# Altium footprint library 4.49-接插件.PcbLib: 260 footprints (part 12 of 17)
Each footprint in its own frame and in the unit in brackets; x right, y up, seen from the top. Pads: shape width x height; smd on the part's side, far side on the other; paste and mask are expansions set on the pad; w line width, h text height; cw(c..) or ccw(c..) is an arc to the next point about the centre after c.
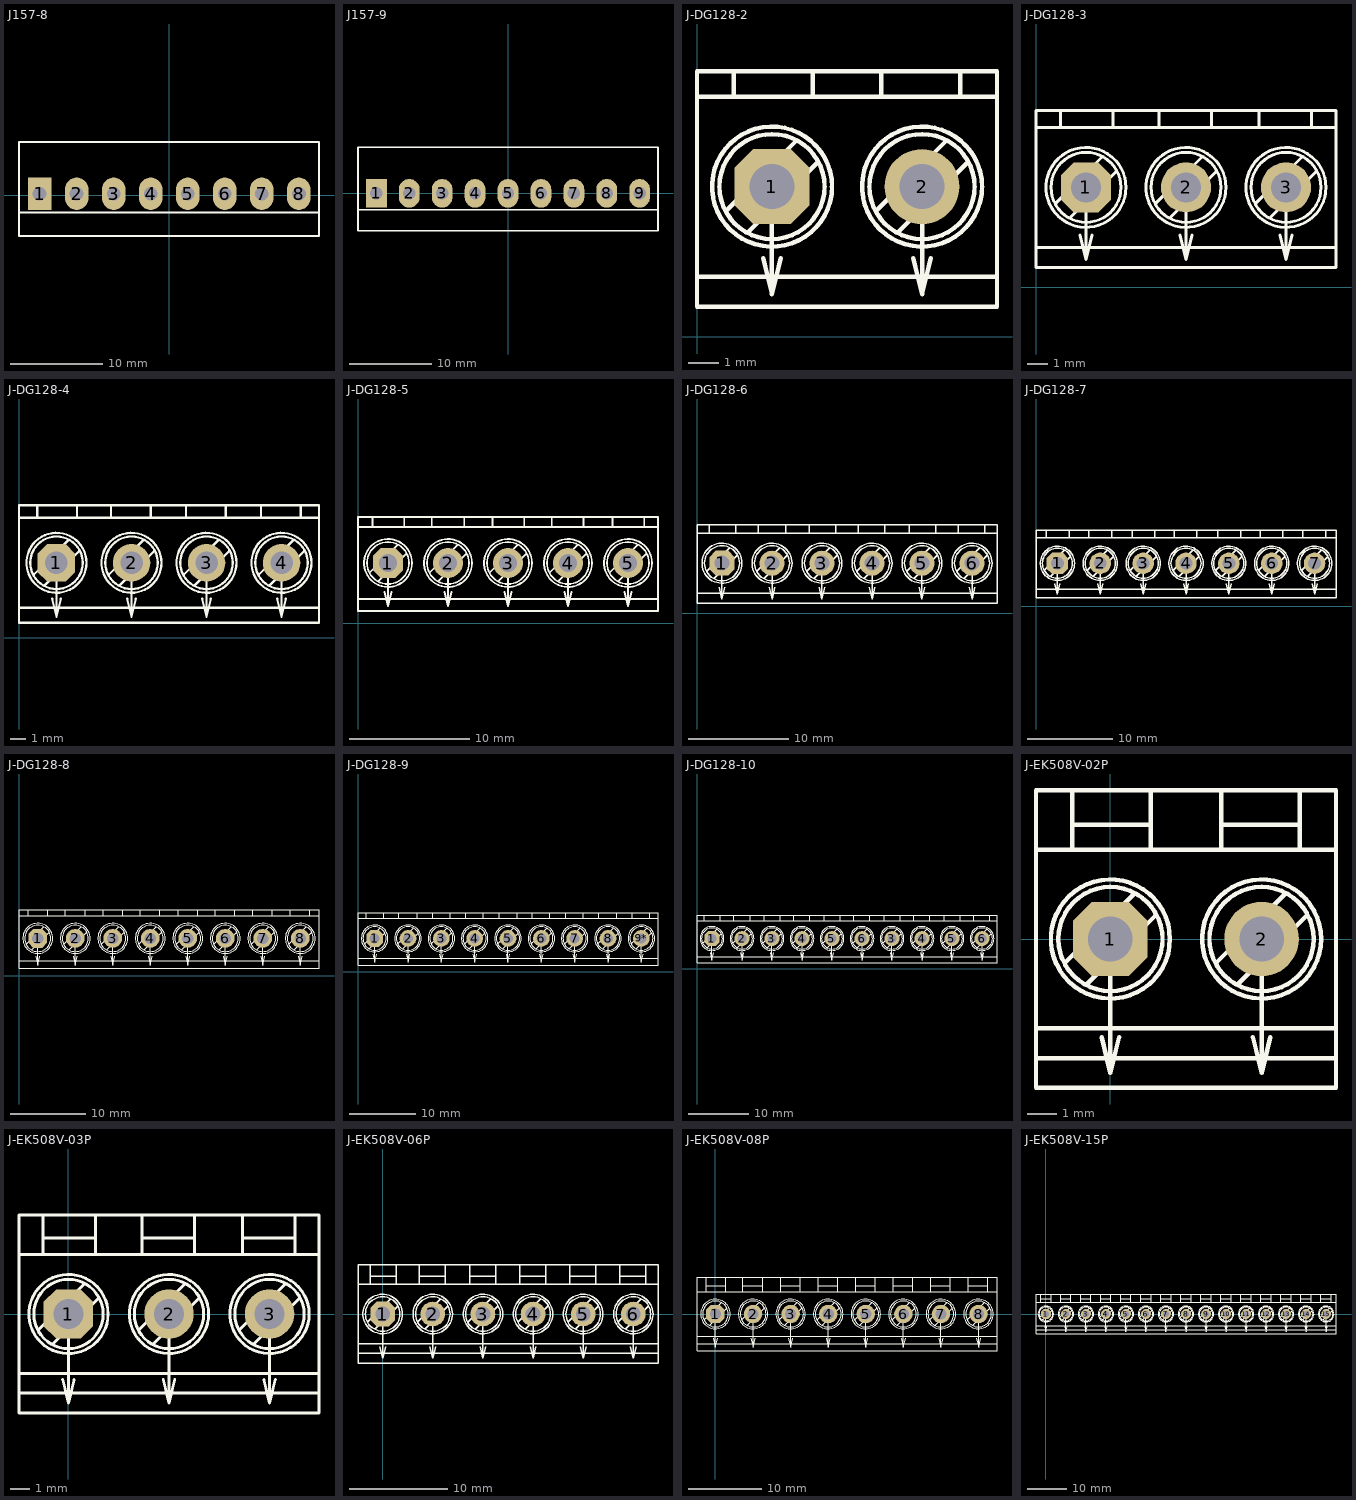
[diagram p11: the footprints below, top view; thin cyan lines are the x and y axes]

## J157-8 [mil] "[ PCBѧϰȺ514746572 ]"
pads (8):
  rect 100x138 hole 59: 1(-554,6.79)
  oval 100x138 hole 59: 2(-396,6.79) 3(-238,6.79) 4(-80,6.79) 5(78,6.79) 6(236,6.79) 7(394,6.79) 8(552,6.79)
Top Overlay:
  lines w8: -642,-73.21 638,-73.21 ; -642,-173.21 638,-173.21 638,226.79 -642,226.79 -642,-173.21
3D body "4514.stp": height 585, standoff -135, extent -619,-188 623,206

## J157-9 [mil] "[ PCBѧϰȺ514746572 ]"
pads (9):
  rect 100x138 hole 59: 1(-632,0)
  oval 100x138 hole 59: 2(-474,0) 3(-316,0) 4(-158,0) 5(0,0) 6(158,0) 7(316,0) 8(474,0) 9(632,0)
Top Overlay:
  lines w8: -720,-79.21 720,-79.21 ; 718,220.79 -720,220.79 -720,-179.21 720,-179.21 720,220.79
3D body "4877.stp": height 575, standoff -145, extent -699,-194 699,200

## J-DG128-2 [mm] "[ PCBѧϰȺ514746572 ]"
pads (2):
  oct 2.5x2.5 hole 1.5: 1(2.5,5)
  round 2.5 hole 1.5: 2(7.5,5)
Top Overlay:
  circle w0.15: c7.5,5 r2
  circle w0.15: c7.5,5 r1.75
  circle w0.15: c2.5,5 r2
  circle w0.15: c2.5,5 r1.75
  lines w0.15: 0,2 10,2 ; 0,8 10,8 ; 0.987,4.209 3.298,6.52 ; 1.219,8 1.219,8.839 ; 1.702,3.48 4.013,5.791 ; 2.21,2.611 2.5,1.406 ; 2.5,5 2.5,1.406 ; 2.79,2.611 2.5,1.406 ; 3.861,8 3.861,8.839 ; 5.987,4.209 8.298,6.52 ; 6.139,8 6.139,8.839 ; 6.702,3.48 9.013,5.791 ; 7.21,2.611 7.5,1.406 ; 7.5,5 7.5,1.406 ; 7.79,2.611 7.5,1.406 ; 8.781,8 8.781,8.839 ; 0,1 10,1 10,8.839 0,8.839 0,1
3D body "User Library-CN_BT_1X2.step": height 10, standoff -2.28, extent -0.491,1.15 10.009,8.85

## J-DG128-3 [mm] "[ PCBѧϰȺ514746572 ]"
pads (3):
  oct 2.5x2.5 hole 1.5: 1(2.5,5)
  round 2.5 hole 1.5: 2(7.5,5) 3(12.5,5)
Top Overlay:
  circle w0.15: c12.5,5 r1.75
  circle w0.15: c12.5,5 r2
  circle w0.15: c2.5,5 r1.75
  circle w0.15: c2.5,5 r2
  circle w0.15: c7.5,5 r1.75
  circle w0.15: c7.5,5 r2
  lines w0.15: 0,2 15,2 ; 0,8 15,8 ; 0.987,4.209 3.298,6.52 ; 1.219,8 1.219,8.839 ; 1.702,3.48 4.013,5.791 ; 2.21,2.611 2.5,1.406 ; 2.5,5 2.5,1.406 ; 2.79,2.611 2.5,1.406 ; 3.861,8 3.861,8.839 ; 5.987,4.209 8.298,6.52 ; 6.139,8 6.139,8.839 ; 6.702,3.48 9.013,5.791 ; 7.21,2.611 7.5,1.406 ; 7.5,5 7.5,1.406 ; 7.79,2.611 7.5,1.406 ; 8.781,8 8.781,8.839 ; 10.987,4.209 13.298,6.52 ; 11.139,8 11.139,8.839 ; 11.702,3.48 14.013,5.791 ; 12.21,2.611 12.5,1.406 ; 12.5,5 12.5,1.406 ; 12.79,2.611 12.5,1.406 ; 13.781,8 13.781,8.839 ; 0,1 0,8.839 15,8.839 15,1 0,1
3D body "User Library-CN_BT_1X3.step": height 10.05, standoff -2.24, extent -0.556,1.15 14.944,8.85

## J-DG128-4 [mm] "[ PCBѧϰȺ514746572 ]"
pads (4):
  oct 2.5x2.5 hole 1.5: 1(2.5,5)
  round 2.5 hole 1.5: 2(7.5,5) 3(12.5,5) 4(17.5,5)
Top Overlay:
  circle w0.15: c17.5,5 r2
  circle w0.15: c17.5,5 r1.75
  circle w0.15: c12.5,5 r1.75
  circle w0.15: c12.5,5 r2
  circle w0.15: c2.5,5 r1.75
  circle w0.15: c2.5,5 r2
  circle w0.15: c7.5,5 r1.75
  circle w0.15: c7.5,5 r2
  lines w0.15: 0,2 20,2 ; 0,8 20,8 ; 0.987,4.209 3.298,6.52 ; 1.219,8 1.219,8.839 ; 1.702,3.48 4.013,5.791 ; 2.21,2.611 2.5,1.406 ; 2.5,5 2.5,1.406 ; 2.79,2.611 2.5,1.406 ; 3.861,8 3.861,8.839 ; 5.987,4.209 8.298,6.52 ; 6.139,8 6.139,8.839 ; 6.702,3.48 9.013,5.791 ; 7.21,2.611 7.5,1.406 ; 7.5,5 7.5,1.406 ; 7.79,2.611 7.5,1.406 ; 8.781,8 8.781,8.839 ; 10.987,4.209 13.298,6.52 ; 11.139,8 11.139,8.839 ; 11.702,3.48 14.013,5.791 ; 12.21,2.611 12.5,1.406 ; 12.5,5 12.5,1.406 ; 12.79,2.611 12.5,1.406 ; 13.781,8 13.781,8.839 ; 15.987,4.209 18.298,6.52 ; 16.139,8 16.139,8.839 ; 16.702,3.48 19.013,5.791 ; 17.21,2.611 17.5,1.406 ; 17.5,5 17.5,1.406 ; 17.79,2.611 17.5,1.406 ; 18.781,8 18.781,8.839 ; 0,1 0,8.839 20,8.839 20,1 0,1
3D body "SW3dPS-KRM4.STEP": height 10, standoff -4, extent 0,1.414 20,8.914

## J-DG128-5 [mm] "[ PCBѧϰȺ514746572 ]"
pads (5):
  oct 2.5x2.5 hole 1.5: 1(2.5,5)
  round 2.5 hole 1.5: 2(7.5,5) 3(12.5,5) 4(17.5,5) 5(22.5,5)
Top Overlay:
  circle w0.15: c7.5,5 r2
  circle w0.15: c7.5,5 r1.75
  circle w0.15: c2.5,5 r2
  circle w0.15: c2.5,5 r1.75
  circle w0.15: c12.5,5 r1.75
  circle w0.15: c12.5,5 r2
  circle w0.15: c17.5,5 r1.75
  circle w0.15: c17.5,5 r2
  circle w0.15: c22.5,5 r1.75
  circle w0.15: c22.5,5 r2
  lines w0.15: 0,2 10,2 20,2 24.958,2 ; 0,8 10,8 20,8 24.958,8 ; 0.987,4.209 3.298,6.52 ; 1.219,8 1.219,8.839 ; 1.702,3.48 4.013,5.791 ; 2.21,2.611 2.5,1.406 ; 2.5,5 2.5,1.406 ; 2.79,2.611 2.5,1.406 ; 3.861,8 3.861,8.839 ; 5.987,4.209 8.298,6.52 ; 6.139,8 6.139,8.839 ; 6.702,3.48 9.013,5.791 ; 7.21,2.611 7.5,1.406 ; 7.5,5 7.5,1.406 ; 7.79,2.611 7.5,1.406 ; 8.861,8 8.861,8.839 ; 10.987,4.209 13.298,6.52 ; 11.219,8 11.219,8.839 ; 11.702,3.48 14.013,5.791 ; 12.21,2.611 12.5,1.406 ; 12.5,5 12.5,1.406 ; 12.79,2.611 12.5,1.406 ; 13.861,8 13.861,8.839 ; 15.987,4.209 18.298,6.52 ; 16.139,8 16.139,8.839 ; 16.702,3.48 19.013,5.791 ; 17.21,2.611 17.5,1.406 ; 17.5,5 17.5,1.406 ; 17.79,2.611 17.5,1.406 ; 18.781,8 18.781,8.839 ; 20.987,4.209 23.298,6.52 ; 21.219,8 21.219,8.839 ; 21.702,3.48 24.013,5.791 ; 22.21,2.611 22.5,1.406 ; 22.5,5 22.5,1.406 ; 22.79,2.611 22.5,1.406 ; 23.861,8 23.861,8.839 ; 24.958,1 20,1 10,1 0,1 0,8.839 24.958,8.839 ; 25,1 25,8.839
3D body "SW3dPS-KRM5.STEP": height 10, standoff -4, extent -0.021,1.414 24.979,8.914

## J-DG128-6 [mm] "[ PCBѧϰȺ514746572 ]"
pads (6):
  oct 2.5x2.5 hole 1.5: 1(2.5,5)
  round 2.5 hole 1.5: 2(7.5,5) 3(12.5,5) 4(17.5,5) 5(22.5,5) 6(27.5,5)
Top Overlay:
  circle w0.15: c27.5,5 r2
  circle w0.15: c27.5,5 r1.75
  circle w0.15: c22.5,5 r2
  circle w0.15: c22.5,5 r1.75
  circle w0.15: c17.5,5 r2
  circle w0.15: c17.5,5 r1.75
  circle w0.15: c12.5,5 r2
  circle w0.15: c12.5,5 r1.75
  circle w0.15: c2.5,5 r1.75
  circle w0.15: c2.5,5 r2
  circle w0.15: c7.5,5 r1.75
  circle w0.15: c7.5,5 r2
  lines w0.15: 0,2 10,2 20,2 30,2 ; 0,8 10,8 20,8 30,8 ; 0.987,4.209 3.298,6.52 ; 1.219,8 1.219,8.839 ; 1.702,3.48 4.013,5.791 ; 2.21,2.611 2.5,1.406 ; 2.5,5 2.5,1.406 ; 2.79,2.611 2.5,1.406 ; 3.861,8 3.861,8.839 ; 5.987,4.209 8.298,6.52 ; 6.139,8 6.139,8.839 ; 6.702,3.48 9.013,5.791 ; 7.21,2.611 7.5,1.406 ; 7.5,5 7.5,1.406 ; 7.79,2.611 7.5,1.406 ; 8.861,8 8.861,8.839 ; 10.987,4.209 13.298,6.52 ; 11.219,8 11.219,8.839 ; 11.702,3.48 14.013,5.791 ; 12.21,2.611 12.5,1.406 ; 12.5,5 12.5,1.406 ; 12.79,2.611 12.5,1.406 ; 13.861,8 13.861,8.839 ; 15.987,4.209 18.298,6.52 ; 16.139,8 16.139,8.839 ; 16.702,3.48 19.013,5.791 ; 17.21,2.611 17.5,1.406 ; 17.5,5 17.5,1.406 ; 17.79,2.611 17.5,1.406 ; 18.781,8 18.781,8.839 ; 20.987,4.209 23.298,6.52 ; 21.219,8 21.219,8.839 ; 21.702,3.48 24.013,5.791 ; 22.21,2.611 22.5,1.406 ; 22.5,5 22.5,1.406 ; 22.79,2.611 22.5,1.406 ; 23.861,8 23.861,8.839 ; 25.987,4.209 28.298,6.52 ; 26.139,8 26.139,8.839 ; 26.702,3.48 29.013,5.791 ; 27.21,2.611 27.5,1.406 ; 27.5,5 27.5,1.406 ; 27.79,2.611 27.5,1.406 ; 28.781,8 28.781,8.839 ; 0,1 0,8.839 30,8.839 30,1 20,1 10,1 0,1
3D body "SW3dPS-KRM6.STEP": height 10, standoff -4, extent 0,1.414 30,8.914

## J-DG128-7 [mm] "[ PCBѧϰȺ514746572 ]"
pads (7):
  oct 2.5x2.5 hole 1.5: 1(2.5,5)
  round 2.5 hole 1.5: 2(7.5,5) 3(12.5,5) 4(17.5,5) 5(22.5,5) 6(27.5,5) 7(32.5,5)
Top Overlay:
  circle w0.15: c32.5,5 r2
  circle w0.15: c32.5,5 r1.75
  circle w0.15: c7.5,5 r2
  circle w0.15: c7.5,5 r1.75
  circle w0.15: c2.5,5 r2
  circle w0.15: c2.5,5 r1.75
  circle w0.15: c12.5,5 r1.75
  circle w0.15: c12.5,5 r2
  circle w0.15: c17.5,5 r1.75
  circle w0.15: c17.5,5 r2
  circle w0.15: c22.5,5 r1.75
  circle w0.15: c22.5,5 r2
  circle w0.15: c27.5,5 r1.75
  circle w0.15: c27.5,5 r2
  lines w0.15: 0,2 10,2 20,2 35,2 ; 0,8 10,8 20,8 35,8 ; 0.987,4.209 3.298,6.52 ; 1.219,8 1.219,8.839 ; 1.702,3.48 4.013,5.791 ; 2.21,2.611 2.5,1.406 ; 2.5,5 2.5,1.406 ; 2.79,2.611 2.5,1.406 ; 3.861,8 3.861,8.839 ; 5.987,4.209 8.298,6.52 ; 6.139,8 6.139,8.839 ; 6.702,3.48 9.013,5.791 ; 7.21,2.611 7.5,1.406 ; 7.5,5 7.5,1.406 ; 7.79,2.611 7.5,1.406 ; 8.861,8 8.861,8.839 ; 10.987,4.209 13.298,6.52 ; 11.219,8 11.219,8.839 ; 11.702,3.48 14.013,5.791 ; 12.21,2.611 12.5,1.406 ; 12.5,5 12.5,1.406 ; 12.79,2.611 12.5,1.406 ; 13.861,8 13.861,8.839 ; 15.987,4.209 18.298,6.52 ; 16.139,8 16.139,8.839 ; 16.702,3.48 19.013,5.791 ; 17.21,2.611 17.5,1.406 ; 17.5,5 17.5,1.406 ; 17.79,2.611 17.5,1.406 ; 18.781,8 18.781,8.839 ; 20.987,4.209 23.298,6.52 ; 21.219,8 21.219,8.839 ; 21.702,3.48 24.013,5.791 ; 22.21,2.611 22.5,1.406 ; 22.5,5 22.5,1.406 ; 22.79,2.611 22.5,1.406 ; 23.861,8 23.861,8.839 ; 25.987,4.209 28.298,6.52 ; 26.139,8 26.139,8.839 ; 26.702,3.48 29.013,5.791 ; 27.21,2.611 27.5,1.406 ; 27.5,5 27.5,1.406 ; 27.79,2.611 27.5,1.406 ; 28.781,8 28.781,8.839 ; 30.987,4.209 33.298,6.52 ; 31.139,8 31.139,8.839 ; 31.702,3.48 34.013,5.791 ; 32.21,2.611 32.5,1.406 ; 32.5,5 32.5,1.406 ; 32.79,2.611 32.5,1.406 ; 33.781,8 33.781,8.839 ; 0,1 10,1 20,1 35,1 35,8.839 0,8.839 0,1
3D body "SW3dPS-KRM7.STEP": height 10, standoff -4, extent 0,1.414 35,8.914

## J-DG128-8 [mm] "[ PCBѧϰȺ514746572 ]"
pads (8):
  oct 2.5x2.5 hole 1.5: 1(2.5,5)
  round 2.5 hole 1.5: 2(7.5,5) 3(12.5,5) 4(17.5,5) 5(22.5,5) 6(27.5,5) 7(32.5,5) 8(37.5,5)
Top Overlay:
  circle w0.15: c37.5,5 r2
  circle w0.15: c37.5,5 r1.75
  circle w0.15: c27.5,5 r2
  circle w0.15: c27.5,5 r1.75
  circle w0.15: c22.5,5 r2
  circle w0.15: c22.5,5 r1.75
  circle w0.15: c17.5,5 r2
  circle w0.15: c17.5,5 r1.75
  circle w0.15: c12.5,5 r2
  circle w0.15: c12.5,5 r1.75
  circle w0.15: c2.5,5 r1.75
  circle w0.15: c2.5,5 r2
  circle w0.15: c7.5,5 r1.75
  circle w0.15: c7.5,5 r2
  circle w0.15: c32.5,5 r1.75
  circle w0.15: c32.5,5 r2
  lines w0.15: 0,2 10,2 20,2 40,2 ; 0,8 10,8 20,8 40,8 ; 0.987,4.209 3.298,6.52 ; 1.219,8 1.219,8.839 ; 1.702,3.48 4.013,5.791 ; 2.21,2.611 2.5,1.406 ; 2.5,5 2.5,1.406 ; 2.79,2.611 2.5,1.406 ; 3.861,8 3.861,8.839 ; 5.987,4.209 8.298,6.52 ; 6.139,8 6.139,8.839 ; 6.702,3.48 9.013,5.791 ; 7.21,2.611 7.5,1.406 ; 7.5,5 7.5,1.406 ; 7.79,2.611 7.5,1.406 ; 8.861,8 8.861,8.839 ; 10.987,4.209 13.298,6.52 ; 11.219,8 11.219,8.839 ; 11.702,3.48 14.013,5.791 ; 12.21,2.611 12.5,1.406 ; 12.5,5 12.5,1.406 ; 12.79,2.611 12.5,1.406 ; 13.861,8 13.861,8.839 ; 15.987,4.209 18.298,6.52 ; 16.139,8 16.139,8.839 ; 16.702,3.48 19.013,5.791 ; 17.21,2.611 17.5,1.406 ; 17.5,5 17.5,1.406 ; 17.79,2.611 17.5,1.406 ; 18.781,8 18.781,8.839 ; 20.987,4.209 23.298,6.52 ; 21.219,8 21.219,8.839 ; 21.702,3.48 24.013,5.791 ; 22.21,2.611 22.5,1.406 ; 22.5,5 22.5,1.406 ; 22.79,2.611 22.5,1.406 ; 23.861,8 23.861,8.839 ; 25.987,4.209 28.298,6.52 ; 26.139,8 26.139,8.839 ; 26.702,3.48 29.013,5.791 ; 27.21,2.611 27.5,1.406 ; 27.5,5 27.5,1.406 ; 27.79,2.611 27.5,1.406 ; 28.781,8 28.781,8.839 ; 30.987,4.209 33.298,6.52 ; 31.139,8 31.139,8.839 ; 31.702,3.48 34.013,5.791 ; 32.21,2.611 32.5,1.406 ; 32.5,5 32.5,1.406 ; 32.79,2.611 32.5,1.406 ; 33.781,8 33.781,8.839 ; 35.987,4.209 38.298,6.52 ; 36.139,8 36.139,8.839 ; 36.702,3.48 39.013,5.791 ; 37.21,2.611 37.5,1.406 ; 37.5,5 37.5,1.406 ; 37.79,2.611 37.5,1.406 ; 38.781,8 38.781,8.839 ; 0,1 0,8.839 40,8.839 40,1 20,1 10,1 0,1
3D body "SW3dPS-KRM8.STEP": height 10, standoff -4, extent 0,1.414 40,8.914

## J-DG128-9 [mm] "[ PCBѧϰȺ514746572 ]"
pads (9):
  oct 2.5x2.5 hole 1.5: 1(2.5,5)
  round 2.5 hole 1.5: 2(7.5,5) 3(12.5,5) 4(17.5,5) 5(22.5,5) 6(27.5,5) 7(32.5,5) 8(37.5,5) 9*(42.5,5)
Top Overlay:
  circle w0.15: c42.5,5 r1.75
  circle w0.15: c42.5,5 r2
  circle w0.15: c37.5,5 r2
  circle w0.15: c37.5,5 r1.75
  circle w0.15: c27.5,5 r2
  circle w0.15: c27.5,5 r1.75
  circle w0.15: c22.5,5 r2
  circle w0.15: c22.5,5 r1.75
  circle w0.15: c17.5,5 r2
  circle w0.15: c17.5,5 r1.75
  circle w0.15: c12.5,5 r2
  circle w0.15: c12.5,5 r1.75
  circle w0.15: c2.5,5 r1.75
  circle w0.15: c2.5,5 r2
  circle w0.15: c7.5,5 r1.75
  circle w0.15: c7.5,5 r2
  circle w0.15: c32.5,5 r1.75
  circle w0.15: c32.5,5 r2
  lines w0.15: 0,2 10,2 20,2 45,2 ; 0,8 10,8 20,8 45,8 ; 0.987,4.209 3.298,6.52 ; 1.219,8 1.219,8.839 ; 1.702,3.48 4.013,5.791 ; 2.21,2.611 2.5,1.406 ; 2.5,5 2.5,1.406 ; 2.79,2.611 2.5,1.406 ; 3.861,8 3.861,8.839 ; 5.987,4.209 8.298,6.52 ; 6.139,8 6.139,8.839 ; 6.702,3.48 9.013,5.791 ; 7.21,2.611 7.5,1.406 ; 7.5,5 7.5,1.406 ; 7.79,2.611 7.5,1.406 ; 8.861,8 8.861,8.839 ; 10.987,4.209 13.298,6.52 ; 11.219,8 11.219,8.839 ; 11.702,3.48 14.013,5.791 ; 12.21,2.611 12.5,1.406 ; 12.5,5 12.5,1.406 ; 12.79,2.611 12.5,1.406 ; 13.861,8 13.861,8.839 ; 15.987,4.209 18.298,6.52 ; 16.139,8 16.139,8.839 ; 16.702,3.48 19.013,5.791 ; 17.21,2.611 17.5,1.406 ; 17.5,5 17.5,1.406 ; 17.79,2.611 17.5,1.406 ; 18.781,8 18.781,8.839 ; 20.987,4.209 23.298,6.52 ; 21.219,8 21.219,8.839 ; 21.702,3.48 24.013,5.791 ; 22.21,2.611 22.5,1.406 ; 22.5,5 22.5,1.406 ; 22.79,2.611 22.5,1.406 ; 23.861,8 23.861,8.839 ; 25.987,4.209 28.298,6.52 ; 26.139,8 26.139,8.839 ; 26.702,3.48 29.013,5.791 ; 27.21,2.611 27.5,1.406 ; 27.5,5 27.5,1.406 ; 27.79,2.611 27.5,1.406 ; 28.781,8 28.781,8.839 ; 30.987,4.209 33.298,6.52 ; 31.139,8 31.139,8.839 ; 31.702,3.48 34.013,5.791 ; 32.21,2.611 32.5,1.406 ; 32.5,5 32.5,1.406 ; 32.79,2.611 32.5,1.406 ; 33.781,8 33.781,8.839 ; 35.987,4.209 38.298,6.52 ; 36.139,8 36.139,8.839 ; 36.702,3.48 39.013,5.791 ; 37.21,2.611 37.5,1.406 ; 37.5,5 37.5,1.406 ; 37.79,2.611 37.5,1.406 ; 38.781,8 38.781,8.839 ; 40.987,4.209 43.298,6.52 ; 41.139,8 41.139,8.839 ; 41.702,3.48 44.013,5.791 ; 42.21,2.611 42.5,1.406 ; 42.5,5 42.5,1.406 ; 42.79,2.611 42.5,1.406 ; 43.781,8 43.781,8.839 ; 0,1 0,8.839 45,8.839 45,1 20,1 10,1 0,1
3D body "SW3dPS-KRM9.STEP": height 9.56, standoff -4.44, extent 0,1.414 45,8.914

## J-DG128-10 [mm] "[ PCBѧϰȺ514746572 ]"
pads (10):
  oct 2.5x2.5 hole 1.5: 1(2.5,5)
  round 2.5 hole 1.5: 2(7.5,5) 3(12.5,5) 3(32.5,5) 4(17.5,5) 4(37.5,5) 5(22.5,5) 5(42.5,5) 6(27.5,5) 6(47.5,5)
Top Overlay:
  circle w0.15: c32.5,5 r1.75
  circle w0.15: c32.5,5 r2
  circle w0.15: c37.5,5 r1.75
  circle w0.15: c37.5,5 r2
  circle w0.15: c42.5,5 r1.75
  circle w0.15: c42.5,5 r2
  circle w0.15: c47.5,5 r1.75
  circle w0.15: c47.5,5 r2
  circle w0.15: c27.5,5 r2
  circle w0.15: c27.5,5 r1.75
  circle w0.15: c22.5,5 r2
  circle w0.15: c22.5,5 r1.75
  circle w0.15: c17.5,5 r2
  circle w0.15: c17.5,5 r1.75
  circle w0.15: c12.5,5 r2
  circle w0.15: c12.5,5 r1.75
  circle w0.15: c2.5,5 r1.75
  circle w0.15: c2.5,5 r2
  circle w0.15: c7.5,5 r1.75
  circle w0.15: c7.5,5 r2
  lines w0.15: 0,2 10,2 20,2 30,2 40,2 50,2 ; 0,8 10,8 20,8 30,8 40,8 50,8 ; 0.987,4.209 3.298,6.52 ; 1.219,8 1.219,8.839 ; 1.702,3.48 4.013,5.791 ; 2.21,2.611 2.5,1.406 ; 2.5,5 2.5,1.406 ; 2.79,2.611 2.5,1.406 ; 3.861,8 3.861,8.839 ; 5.987,4.209 8.298,6.52 ; 6.139,8 6.139,8.839 ; 6.702,3.48 9.013,5.791 ; 7.21,2.611 7.5,1.406 ; 7.5,5 7.5,1.406 ; 7.79,2.611 7.5,1.406 ; 8.861,8 8.861,8.839 ; 10.987,4.209 13.298,6.52 ; 11.219,8 11.219,8.839 ; 11.702,3.48 14.013,5.791 ; 12.21,2.611 12.5,1.406 ; 12.5,5 12.5,1.406 ; 12.79,2.611 12.5,1.406 ; 13.861,8 13.861,8.839 ; 15.987,4.209 18.298,6.52 ; 16.139,8 16.139,8.839 ; 16.702,3.48 19.013,5.791 ; 17.21,2.611 17.5,1.406 ; 17.5,5 17.5,1.406 ; 17.79,2.611 17.5,1.406 ; 18.781,8 18.781,8.839 ; 20.987,4.209 23.298,6.52 ; 21.219,8 21.219,8.839 ; 21.702,3.48 24.013,5.791 ; 22.21,2.611 22.5,1.406 ; 22.5,5 22.5,1.406 ; 22.79,2.611 22.5,1.406 ; 23.861,8 23.861,8.839 ; 25.987,4.209 28.298,6.52 ; 26.139,8 26.139,8.839 ; 26.702,3.48 29.013,5.791 ; 27.21,2.611 27.5,1.406 ; 27.5,5 27.5,1.406 ; 27.79,2.611 27.5,1.406 ; 28.781,8 28.781,8.839 ; 30.987,4.209 33.298,6.52 ; 31.219,8 31.219,8.839 ; 31.702,3.48 34.013,5.791 ; 32.21,2.611 32.5,1.406 ; 32.5,5 32.5,1.406 ; 32.79,2.611 32.5,1.406 ; 33.861,8 33.861,8.839 ; 35.987,4.209 38.298,6.52 ; 36.139,8 36.139,8.839 ; 36.702,3.48 39.013,5.791 ; 37.21,2.611 37.5,1.406 ; 37.5,5 37.5,1.406 ; 37.79,2.611 37.5,1.406 ; 38.781,8 38.781,8.839 ; 40.987,4.209 43.298,6.52 ; 41.219,8 41.219,8.839 ; 41.702,3.48 44.013,5.791 ; 42.21,2.611 42.5,1.406 ; 42.5,5 42.5,1.406 ; 42.79,2.611 42.5,1.406 ; 43.861,8 43.861,8.839 ; 45.987,4.209 48.298,6.52 ; 46.139,8 46.139,8.839 ; 46.702,3.48 49.013,5.791 ; 47.21,2.611 47.5,1.406 ; 47.5,5 47.5,1.406 ; 47.79,2.611 47.5,1.406 ; 48.781,8 48.781,8.839 ; 0,1 0,8.839 50,8.839 50,1 40,1 30,1 20,1 10,1 0,1
3D body "SW3dPS-KRM10.STEP": height 10, standoff -4, extent 0,1.414 50,8.914

## J-EK508V-02P [mm] "[ PCBѧϰȺ514746572 ]"
pads (2):
  oct 2.5x2.5 hole 1.5: 1(0,0)
  round 2.5 hole 1.5: 2(5.08,0)
Top Overlay:
  circle w0.15: c0,0 r1.75
  circle w0.15: c0,0 r2
  circle w0.15: c5.08,0 r1.75
  circle w0.15: c5.08,0 r2
  lines w0.15: -2.5,-4 7.57,-4 ; -2.5,-3 7.57,-3 ; -2.5,3 7.575,3 ; -1.513,-0.791 0.798,1.52 ; -1.281,3 -1.281,5 ; -1.281,3.839 1.361,3.839 ; -0.798,-1.52 1.513,0.791 ; -0.29,-3.298 0,-4.503 ; 0,0 0,-4.503 ; 0.29,-3.298 0,-4.503 ; 1.361,3 1.361,5 ; 3.567,-0.791 5.878,1.52 ; 3.719,3 3.719,5 ; 3.719,3.839 6.361,3.839 ; 4.282,-1.52 6.593,0.791 ; 4.79,-3.298 5.08,-4.503 ; 5.08,0 5.08,-4.503 ; 5.37,-3.298 5.08,-4.503 ; 6.361,3 6.361,5 ; -2.5,-5 -2.5,5 7.58,5 7.58,-5 -2.5,-5
3D body "User Library-EK508V-02P.step": height 13.8, standoff -3.5, extent -2.54,-5 7.62,5

## J-EK508V-03P [mm] "[ PCBѧϰȺ514746572 ]"
pads (3):
  oct 2.5x2.5 hole 1.5: 1(0,0)
  round 2.5 hole 1.5: 2(5.08,0) 3(10.16,0)
Top Overlay:
  circle w0.15: c5.08,0 r2
  circle w0.15: c5.08,0 r1.75
  circle w0.15: c0,0 r2
  circle w0.15: c0,0 r1.75
  circle w0.15: c10.16,0 r1.75
  circle w0.15: c10.16,0 r2
  lines w0.15: -2.5,-4 12.66,-4 ; -2.5,-3 12.66,-3 ; -2.5,3 12.66,3 ; -1.513,-0.791 0.798,1.52 ; -1.281,3 -1.281,5 ; -1.281,3.839 1.361,3.839 ; -0.798,-1.52 1.513,0.791 ; -0.29,-3.298 0,-4.503 ; 0,0 0,-4.503 ; 0.29,-3.298 0,-4.503 ; 1.361,3 1.361,5 ; 3.567,-0.791 5.878,1.52 ; 3.719,3 3.719,5 ; 3.719,3.839 6.361,3.839 ; 4.282,-1.52 6.593,0.791 ; 4.79,-3.298 5.08,-4.503 ; 5.08,0 5.08,-4.503 ; 5.37,-3.298 5.08,-4.503 ; 6.361,3 6.361,5 ; 8.647,-0.791 10.958,1.52 ; 8.799,3 8.799,5 ; 8.799,3.839 11.441,3.839 ; 9.362,-1.52 11.673,0.791 ; 9.87,-3.298 10.16,-4.503 ; 10.16,0 10.16,-4.503 ; 10.45,-3.298 10.16,-4.503 ; 11.441,3 11.441,5 ; -2.5,-5 12.66,-5 12.66,5 -2.5,5 -2.5,-5
3D body "User Library-EK508V-03P.step": height 13.8, standoff -3.5, extent -2.54,-5 12.7,5

## J-EK508V-06P [mm] "[ PCBѧϰȺ514746572 ]"
pads (6):
  oct 2.5x2.5 hole 1.5: 1(0,0)
  round 2.5 hole 1.5: 2(5.08,0) 3(10.16,0) 4(15.24,0) 5(20.32,0) 6(25.4,0)
Top Overlay:
  circle w0.15: c10.16,0 r2
  circle w0.15: c10.16,0 r1.75
  circle w0.15: c0,0 r1.75
  circle w0.15: c0,0 r2
  circle w0.15: c5.08,0 r1.75
  circle w0.15: c5.08,0 r2
  circle w0.15: c15.24,0 r2
  circle w0.15: c15.24,0 r1.75
  circle w0.15: c20.32,0 r1.75
  circle w0.15: c20.32,0 r2
  circle w0.15: c25.4,0 r2
  circle w0.15: c25.4,0 r1.75
  lines w0.15: -2.5,-4 27.9,-4 ; -2.5,-3 27.9,-3 ; -2.5,3 27.9,3 ; -1.513,-0.791 0.798,1.52 ; -1.281,3 -1.281,5 ; -1.281,3.839 1.361,3.839 ; -0.798,-1.52 1.513,0.791 ; -0.29,-3.298 0,-4.503 ; 0,0 0,-4.503 ; 0.29,-3.298 0,-4.503 ; 1.361,3 1.361,5 ; 3.567,-0.791 5.878,1.52 ; 3.719,3 3.719,5 ; 3.719,3.839 6.361,3.839 ; 4.282,-1.52 6.593,0.791 ; 4.79,-3.298 5.08,-4.503 ; 5.08,0 5.08,-4.503 ; 5.37,-3.298 5.08,-4.503 ; 6.361,3 6.361,5 ; 8.647,-0.791 10.958,1.52 ; 8.799,3 8.799,5 ; 8.799,3.839 11.441,3.839 ; 9.362,-1.52 11.673,0.791 ; 9.87,-3.298 10.16,-4.503 ; 10.16,0 10.16,-4.503 ; 10.45,-3.298 10.16,-4.503 ; 11.441,3 11.441,5 ; 13.727,-0.791 16.038,1.52 ; 13.879,3 13.879,5 ; 13.879,3.839 16.521,3.839 ; 14.442,-1.52 16.753,0.791 ; 14.95,-3.298 15.24,-4.503 ; 15.24,0 15.24,-4.503 ; 15.53,-3.298 15.24,-4.503 ; 16.521,3 16.521,5 ; 18.807,-0.791 21.118,1.52 ; 18.959,3 18.959,5 ; 18.959,3.839 21.601,3.839 ; 19.522,-1.52 21.833,0.791 ; 20.03,-3.298 20.32,-4.503 ; 20.32,0 20.32,-4.503 ; 20.61,-3.298 20.32,-4.503 ; 21.601,3 21.601,5 ; 23.887,-0.791 26.198,1.52 ; 24.039,3 24.039,5 ; 24.039,3.839 26.681,3.839 ; 24.602,-1.52 26.913,0.791 ; 25.11,-3.298 25.4,-4.503 ; 25.4,0 25.4,-4.503 ; 25.69,-3.298 25.4,-4.503 ; 26.681,3 26.681,5 ; -2.5,-5 -2.5,5 27.9,5 27.9,-5 -2.5,-5
3D body "User Library-EK508V-06P.step": height 13.8, standoff -3.5, extent -2.54,-5 27.94,5

## J-EK508V-08P [mm] "[ PCBѧϰȺ514746572 ]"
pads (8):
  oct 2.5x2.5 hole 1.5: 1(0,0)
  round 2.5 hole 1.5: 2(5.08,0) 3(10.16,0) 4(15.24,0) 5(20.32,0) 6(25.4,0) 7(30.48,0) 8(35.56,0)
Top Overlay:
  circle w0.15: c30.48,0 r1.75
  circle w0.15: c30.48,0 r2
  circle w0.15: c35.56,0 r2
  circle w0.15: c35.56,0 r1.75
  circle w0.15: c25.4,0 r1.75
  circle w0.15: c25.4,0 r2
  circle w0.15: c20.32,0 r2
  circle w0.15: c20.32,0 r1.75
  circle w0.15: c15.24,0 r1.75
  circle w0.15: c15.24,0 r2
  circle w0.15: c5.08,0 r2
  circle w0.15: c5.08,0 r1.75
  circle w0.15: c0,0 r2
  circle w0.15: c0,0 r1.75
  circle w0.15: c10.16,0 r1.75
  circle w0.15: c10.16,0 r2
  lines w0.15: -2.5,-4 38.06,-4 ; -2.5,-3 38.06,-3 ; -2.5,3 38.06,3 ; -1.513,-0.791 0.798,1.52 ; -1.281,3 -1.281,5 ; -1.281,3.839 1.361,3.839 ; -0.798,-1.52 1.513,0.791 ; -0.29,-3.298 0,-4.503 ; 0,0 0,-4.503 ; 0.29,-3.298 0,-4.503 ; 1.361,3 1.361,5 ; 3.567,-0.791 5.878,1.52 ; 3.719,3 3.719,5 ; 3.719,3.839 6.361,3.839 ; 4.282,-1.52 6.593,0.791 ; 4.79,-3.298 5.08,-4.503 ; 5.08,0 5.08,-4.503 ; 5.37,-3.298 5.08,-4.503 ; 6.361,3 6.361,5 ; 8.647,-0.791 10.958,1.52 ; 8.799,3 8.799,5 ; 8.799,3.839 11.441,3.839 ; 9.362,-1.52 11.673,0.791 ; 9.87,-3.298 10.16,-4.503 ; 10.16,0 10.16,-4.503 ; 10.45,-3.298 10.16,-4.503 ; 11.441,3 11.441,5 ; 13.727,-0.791 16.038,1.52 ; 13.879,3 13.879,5 ; 13.879,3.839 16.521,3.839 ; 14.442,-1.52 16.753,0.791 ; 14.95,-3.298 15.24,-4.503 ; 15.24,0 15.24,-4.503 ; 15.53,-3.298 15.24,-4.503 ; 16.521,3 16.521,5 ; 18.807,-0.791 21.118,1.52 ; 18.959,3 18.959,5 ; 18.959,3.839 21.601,3.839 ; 19.522,-1.52 21.833,0.791 ; 20.03,-3.298 20.32,-4.503 ; 20.32,0 20.32,-4.503 ; 20.61,-3.298 20.32,-4.503 ; 21.601,3 21.601,5 ; 23.887,-0.791 26.198,1.52 ; 24.039,3 24.039,5 ; 24.039,3.839 26.681,3.839 ; 24.602,-1.52 26.913,0.791 ; 25.11,-3.298 25.4,-4.503 ; 25.4,0 25.4,-4.503 ; 25.69,-3.298 25.4,-4.503 ; 26.681,3 26.681,5 ; 28.967,-0.791 31.278,1.52 ; 29.119,3 29.119,5 ; 29.119,3.839 31.761,3.839 ; 29.682,-1.52 31.993,0.791 ; 30.19,-3.298 30.48,-4.503 ; 30.48,0 30.48,-4.503 ; 30.77,-3.298 30.48,-4.503 ; 31.761,3 31.761,5 ; 34.047,-0.791 36.358,1.52 ; 34.199,3 34.199,5 ; 34.199,3.839 36.841,3.839 ; 34.762,-1.52 37.073,0.791 ; 35.27,-3.298 35.56,-4.503 ; 35.56,0 35.56,-4.503 ; 35.85,-3.298 35.56,-4.503 ; 36.841,3 36.841,5 ; -2.5,-5 38.06,-5 38.06,5 -2.5,5 -2.5,-5
3D body "User Library-Connector-3.step": height 8.64, standoff -1.91, extent 2.679,-10.747 8.902,-3.19
3D body "User Library-Connector-2.step": height 8.64, standoff -1.91, extent 11.62,-9.913 17.843,-4.693
3D body "User Library-Connector-8.step": height 8.64, standoff -1.91, extent 17.335,-3.15 38.035,3.073

## J-EK508V-15P [mm] "[ PCBѧϰȺ514746572 ]"
pads (15):
  oct 2.5x2.5 hole 1.5: 1(0,0)
  round 2.5 hole 1.5: 2(5.08,0) 3(10.16,0) 4(15.24,0) 5(20.32,0) 6(25.4,0) 7(30.48,0) 8(35.56,0) 9(40.64,0) 10(45.72,0) 11(50.8,0) 12(55.88,0) 13(60.96,0) 14(66.04,0) 15(71.12,0)
Top Overlay:
  drawing of 157 lines, arcs and shapes, not listed
3D body "User Library-EK508V-15P.step": height 13.8, standoff -3.5, extent -2.54,-5 73.66,5